# Altium footprint library IDC-Connectors.PcbLib: 32 footprints (part 2 of 2)
Each footprint in its own frame and in the unit in brackets; x right, y up, seen from the top. Pads: shape width x height; smd on the part's side, far side on the other; paste and mask are expansions set on the pad; w line width, h text height; cw(c..) or ccw(c..) is an arc to the next point about the centre after c.
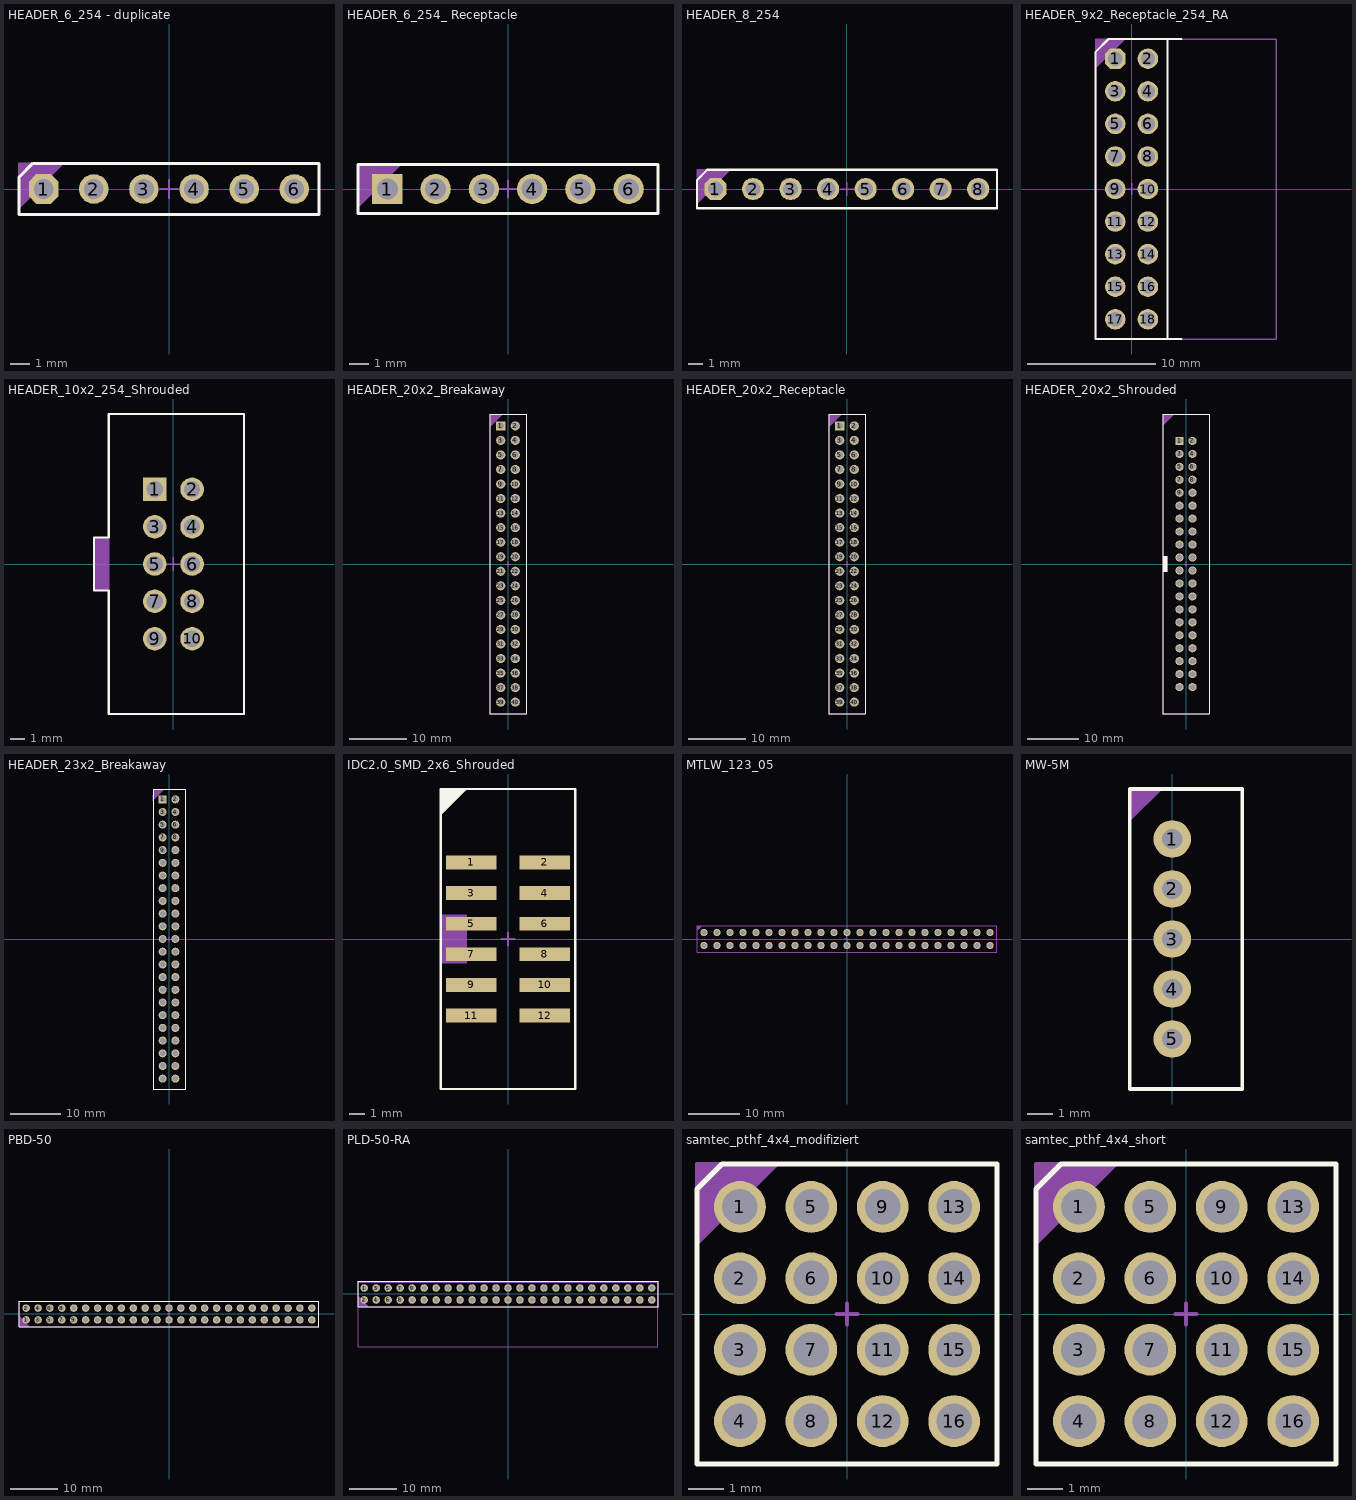
[diagram p1: the footprints below, top view; thin cyan lines are the x and y axes]

## HEADER_6_254 - duplicate [mm]
pads (6):
  oct 1.5x1.5 hole 1: 1(-6.35,0)
  round 1.5 hole 1: 2(-3.81,0) 3(-1.27,0) 4(1.27,0) 5(3.81,0) 6(6.35,0)
Top Overlay:
  lines w0.153: -7.6,-1.3 -7.6,0.6 -6.9,1.3 7.6,1.3 7.6,-1.3 -7.6,-1.3
Top Assembly:
  region: -7.6,1.3 -5.3,1.3 -7.6,-1
  lines w0.1: -7.6,-1.3 -7.6,1.3 7.6,1.3 7.6,-1.3 -7.6,-1.3
  text "'.Designator'" at -4.532,-0.333 h0.8
Top Courtyard:
  lines w0.1: -0.45,0 0.45,0 ; 0,-0.45 0,0.45 ; -7.6,-1.3 -7.6,1.3 7.6,1.3 7.6,-1.3 -7.6,-1.3

## HEADER_6_254_ Receptacle [mm]
pads (6):
  rect 1.6x1.6 hole 1.1: 1(-6.35,0)
  round 1.6 hole 1.1: 2(-3.81,0) 3(-1.27,0) 4(1.27,0) 5(3.81,0) 6(6.35,0)
Top Overlay:
  lines w0.153: -7.9,-1.3 7.9,-1.3 7.9,1.3 -7.9,1.3 -7.9,-1.3
  text "." at -8.796,1.779 h1.52
Top Assembly:
  region: -7.9,1.3 -5.6,1.3 -7.9,-1
  lines w0.1: -7.9,-1.3 -7.9,1.3 7.9,1.3 7.9,-1.3 -7.9,-1.3
  text "'.Designator'" at -4.532,-0.333 h0.8
Top Courtyard:
  lines w0.1: -0.45,0 0.45,0 ; 0,-0.45 0,0.45 ; -7.9,-1.3 -7.9,1.3 7.9,1.3 7.9,-1.3 -7.9,-1.3
3D body "User Library-Header_Fem_1X6 (1).step": height 8.5, standoff -3.2, extent -7.87,-1.27 7.87,1.27

## HEADER_8_254 [mm]
pads (8):
  oct 1.5x1.5 hole 1: 1(-8.89,0)
  round 1.5 hole 1: 2(-6.35,0) 3(-3.81,0) 4(-1.27,0) 5(1.27,0) 6(3.81,0) 7(6.35,0) 8(8.89,0)
Top Overlay:
  lines w0.153: -10.14,-1.3 -10.14,0.6 -9.44,1.3 10.16,1.3 10.16,-1.3 -10.14,-1.3
Top Assembly:
  region: -10.14,1.3 -7.84,1.3 -10.14,-1
  lines w0.1: -10.14,-1.3 -10.14,1.3 10.16,1.3 10.16,-1.3 -10.14,-1.3
  text "'.Designator'" at -4.532,-0.333 h0.8
Top Courtyard:
  lines w0.1: -0.45,0 0.45,0 ; 0,-0.45 0,0.45 ; -10.14,-1.3 -10.14,1.3 10.16,1.3 10.16,-1.3 -10.14,-1.3

## HEADER_9x2_Receptacle_254_RA [mm]
pads (18):
  oct 1.6x1.6 hole 1.1: 1(-1.27,10.16)
  round 1.6 hole 1.1: 2(1.27,10.16) 3(-1.27,7.62) 4(1.27,7.62) 5(-1.27,5.08) 6(1.27,5.08) 7(-1.27,2.54) 8(1.27,2.54) 9(-1.27,0) 10(1.27,0) 11(-1.27,-2.54) 12(1.27,-2.54) 13(-1.27,-5.08) 14(1.27,-5.08) 15(-1.27,-7.62) 16(1.27,-7.62) 17(-1.27,-10.16) 18(1.27,-10.16)
Top Overlay:
  lines w0.153: 2.4,11.7 3.9,11.7 ; 3.9,-11.7 2.8,-11.7 ; 2.8,-11.7 2.8,11.7 -1.8,11.7 -2.81,10.69 -2.81,-11.7 2.8,-11.7
Top Assembly:
  region: -2.8,11.7 -0.5,11.7 -2.8,9.4
  lines w0.1: -2.8,-11.7 -2.8,11.7 11.3,11.7 11.3,-11.7 -2.8,-11.7
  text "'.Designator'" at 0.153,0.42 h0.8
Top Courtyard:
  lines w0.1: -0.45,0 0.45,0 ; 0,-0.45 0,0.45 ; -2.81,-11.7 -2.81,11.7 11.3,11.7 11.3,-11.7 -2.81,-11.7
3D body "SSW_109_02_G_D_RA.STEP": height 4.98, standoff -2.5, extent -1.5,-11.684 11.276,11.684

## HEADER_10x2_254_Shrouded [mm]
pads (10):
  rect 1.6x1.6 hole 1.1: 1(-1.27,5.08)
  round 1.6 hole 1.1: 2(1.27,5.08) 3(-1.27,2.54) 4(1.27,2.54) 5(-1.27,0) 6(1.27,0) 7(-1.27,-2.54) 8(1.27,-2.54) 9(-1.27,-5.08) 10(1.27,-5.08)
Top Overlay:
  lines w0.153: -5.4,-1.8 -5.4,1.8 -4.4,1.8 -4.4,10.2 4.8,10.2 4.8,-10.2 -4.4,-10.2 -4.4,-1.8 -5.4,-1.8
  text "." at -1.346,6.654 h1.52
Top Assembly:
  rectangle: -5.4,-1.8 -4.4,1.8
  lines w0.1: -4.4,-1.8 -4.4,1.8 ; -4.4,-1.8 -4.4,-10.2 4.8,-10.2 4.8,10.2 -4.4,10.2 -4.4,1.8 ; -4.4,-1.8 -5.4,-1.8 -5.4,1.8 -4.4,1.8
  text "'.Designator'" at 0.333,-4.532 h0.8
Top Courtyard:
  rectangle: -5.4,-1.8 -4.4,1.8
  lines w0.1: -0.45,0 0.45,0 ; 0,-0.45 0,0.45 ; -4.4,-1.8 -4.4,1.8 ; -4.4,-1.8 -4.4,-10.2 4.8,-10.2 4.8,10.2 -4.4,10.2 -4.4,1.8 ; -4.4,-1.8 -5.4,-1.8 -5.4,1.8 -4.4,1.8
3D body "61201021621 (rev1).stp": height 9.13, standoff -2.98, extent -4.425,-10.18 4.748,10.18

## HEADER_20x2_Breakaway [mm]
pads (40):
  rect 1.6x1.6 hole 1.1: 1(-1.27,24.13)
  round 1.6 hole 1.1: 2(1.27,24.13) 3(-1.27,21.59) 4(1.27,21.59) 5(-1.27,19.05) 6(1.27,19.05) 7(-1.27,16.51) 8(1.27,16.51) 9(-1.27,13.97) 10(1.27,13.97) 11(-1.27,11.43) 12(1.27,11.43) 13(-1.27,8.89) 14(1.27,8.89) 15(-1.27,6.35) 16(1.27,6.35) 17(-1.27,3.81) 18(1.27,3.81) 19(-1.27,1.27) 20(1.27,1.27) 21(-1.27,-1.27) 22(1.27,-1.27) 23(-1.27,-3.81) 24(1.27,-3.81) 25(-1.27,-6.35) 26(1.27,-6.35) 27(-1.27,-8.89) 28(1.27,-8.89) 29(-1.27,-11.43) 30(1.27,-11.43) 31(-1.27,-13.97) 32(1.27,-13.97) 33(-1.27,-16.51) 34(1.27,-16.51) 35(-1.27,-19.05) 36(1.27,-19.05) 37(-1.27,-21.59) 38(1.27,-21.59) 39(-1.27,-24.13) 40(1.27,-24.13)
Top Overlay:
  lines w0.153: -3.2,-26.2 -3.2,26.2 3.2,26.2 3.2,-26.2 -3.2,-26.2
  text "." at -4.096,26.579 h1.52
Top Assembly:
  region: -3.2,26.2 -0.9,26.2 -3.2,23.9
  lines w0.1: -3.2,-26.2 3.2,-26.2 3.2,26.2 -3.2,26.2 -3.2,-26.2
  text "'.Designator'" at -3.221,26.782 h0.8
Top Courtyard:
  lines w0.1: -0.45,0 0.45,0 ; 0,-0.45 0,0.45 ; -3.2,-26.2 3.2,-26.2 3.2,26.2 -3.2,26.2 -3.2,-26.2
3D body "2-826925-0--3DModel-STEP-1.STEP": height 9.5, standoff -3.2, extent -2.47,-25.47 2.53,25.33

## HEADER_20x2_Receptacle [mm]
pads (40):
  rect 1.6x1.6 hole 1.1: 1(-1.27,24.13)
  round 1.6 hole 1.1: 2(1.27,24.13) 3(-1.27,21.59) 4(1.27,21.59) 5(-1.27,19.05) 6(1.27,19.05) 7(-1.27,16.51) 8(1.27,16.51) 9(-1.27,13.97) 10(1.27,13.97) 11(-1.27,11.43) 12(1.27,11.43) 13(-1.27,8.89) 14(1.27,8.89) 15(-1.27,6.35) 16(1.27,6.35) 17(-1.27,3.81) 18(1.27,3.81) 19(-1.27,1.27) 20(1.27,1.27) 21(-1.27,-1.27) 22(1.27,-1.27) 23(-1.27,-3.81) 24(1.27,-3.81) 25(-1.27,-6.35) 26(1.27,-6.35) 27(-1.27,-8.89) 28(1.27,-8.89) 29(-1.27,-11.43) 30(1.27,-11.43) 31(-1.27,-13.97) 32(1.27,-13.97) 33(-1.27,-16.51) 34(1.27,-16.51) 35(-1.27,-19.05) 36(1.27,-19.05) 37(-1.27,-21.59) 38(1.27,-21.59) 39(-1.27,-24.13) 40(1.27,-24.13)
Top Overlay:
  lines w0.153: -3.2,-26.2 3.2,-26.2 3.2,26.2 -3.2,26.2 -3.2,-26.2
  text "." at -4.396,26.679 h1.52
Top Assembly:
  region: -3.2,26.2 -0.9,26.2 -3.2,23.9
  lines w0.1: -3.2,-26.2 -3.2,26.2 3.2,26.2 3.2,-26.2 -3.2,-26.2
  text "'.Designator'" at -3.521,26.882 h0.8
Top Courtyard:
  lines w0.1: -0.45,0 0.45,0 ; 0,-0.45 0,0.45 ; -3.2,-26.2 -3.2,26.2 3.2,26.2 3.2,-26.2 -3.2,-26.2
3D body "m20-7832046.stp": height 8.5, standoff -3, extent -2.4,-25.6 2.6,25.6

## HEADER_20x2_Shrouded [mm]
pads (40):
  rect 1.6x1.6 hole 1.1: 1(-1.27,24.13)
  round 1.6 hole 1.1: 2(1.27,24.13) 3(-1.27,21.59) 4(1.27,21.59) 5(-1.27,19.05) 6(1.27,19.05) 7(-1.27,16.51) 8(1.27,16.51) 9(-1.27,13.97) 10(1.27,13.97) 11(-1.27,11.43) 12(1.27,11.43) 13(-1.27,8.89) 14(1.27,8.89) 15(-1.27,6.35) 16(1.27,6.35) 17(-1.27,3.81) 18(1.27,3.81) 19(-1.27,1.27) 20(1.27,1.27) 21(-1.27,-1.27) 22(1.27,-1.27) 23(-1.27,-3.81) 24(1.27,-3.81) 25(-1.27,-6.35) 26(1.27,-6.35) 27(-1.27,-8.89) 28(1.27,-8.89) 29(-1.27,-11.43) 30(1.27,-11.43) 31(-1.27,-13.97) 32(1.27,-13.97) 33(-1.27,-16.51) 34(1.27,-16.51) 35(-1.27,-19.05) 36(1.27,-19.05) 37(-1.27,-21.59) 38(1.27,-21.59) 39(-1.27,-24.13) 40(1.27,-24.13)
Top Overlay:
  rectangle: -4.6,-1.6 -3.6,1.6
  lines w0.153: -4.6,-29.4 -4.6,29.4 4.6,29.4 4.6,-29.4 -4.6,-29.4
  text "." at -5.546,30.054 h1.52
Top Assembly:
  rectangle: -4.6,-1.6 -3.6,1.6
  region: -4.6,29.4 -2.3,29.4 -4.6,27.1
  lines w0.1: -4.6,-29.4 4.6,-29.4 4.6,29.4 -4.6,29.4 -4.6,-29.4
  text "'.Designator'" at -4.421,30.282 h0.8
Top Courtyard:
  lines w0.1: -0.45,0 0.45,0 ; 0,-0.45 0,0.45 ; -4.6,-29.4 4.6,-29.4 4.6,29.4 -4.6,29.4 -4.6,-29.4
3D body "702464004.stp": height 9.55, standoff -3.14, extent -4.46,-29.19 4.43,29.23

## HEADER_23x2_Breakaway [mm]
pads (46):
  rect 1.6x1.6 hole 1.1: 1(-1.27,27.94)
  round 1.6 hole 1.1: 2(1.27,27.94) 3(-1.27,25.4) 4(1.27,25.4) 5(-1.27,22.86) 6(1.27,22.86) 7(-1.27,20.32) 8(1.27,20.32) 9(-1.27,17.78) 10(1.27,17.78) 11(-1.27,15.24) 12(1.27,15.24) 13(-1.27,12.7) 14(1.27,12.7) 15(-1.27,10.16) 16(1.27,10.16) 17(-1.27,7.62) 18(1.27,7.62) 19(-1.27,5.08) 20(1.27,5.08) 21(-1.27,2.54) 22(1.27,2.54) 23(-1.27,0) 24(1.27,0) 25(-1.27,-2.54) 26(1.27,-2.54) 27(-1.27,-5.08) 28(1.27,-5.08) 29(-1.27,-7.62) 30(1.27,-7.62) 31(-1.27,-10.16) 32(1.27,-10.16) 33(-1.27,-12.7) 34(1.27,-12.7) 35(-1.27,-15.24) 36(1.27,-15.24) 37(-1.27,-17.78) 38(1.27,-17.78) 39(-1.27,-20.32) 40(1.27,-20.32) 41(-1.27,-22.86) 42(1.27,-22.86) 43(-1.27,-25.4) 44(1.27,-25.4) 45(-1.27,-27.94) 46(1.27,-27.94)
Top Overlay:
  lines w0.153: -3.2,-30 -3.2,30 3.2,30 3.2,-30 -3.2,-30
  text "." at -4.096,30.389 h1.52
Top Assembly:
  region: -3.2,30 -0.9,30 -3.2,27.7
  lines w0.1: -3.2,-30 3.2,-30 3.2,30 -3.2,30 -3.2,-30
  text "'.Designator'" at -3.221,30.592 h0.8
Top Courtyard:
  lines w0.1: -0.45,0 0.45,0 ; 0,-0.45 0,0.45 ; -3.2,-30 3.2,-30 3.2,30 -3.2,30 -3.2,-30
3D body "User Library-46-pin dual header.step": height 8.24, standoff -2.18, extent -2.537,-29.265 2.537,29.155

## IDC2.0_SMD_2x6_Shrouded [mm]
pads (12):
  rect 3.3x0.9 smd: 1(-2.4,5) 2(2.4,5) 3(-2.4,3) 4(2.4,3) 5(-2.4,1) 6(2.4,1) 7(-2.4,-1) 8(2.4,-1) 9(-2.4,-3) 10(2.4,-3) 11(-2.4,-5) 12(2.4,-5)
Top Overlay:
  region: -4.4,9.8 -4.4,8.1 -2.7,9.8
  lines w0.153: -4.4,-9.8 4.4,-9.8 4.4,9.8 -4.4,9.8 -4.4,-9.8
Top Assembly:
  region: -4.4,1.6 -2.7,1.6 -2.7,-1.6 -4.4,-1.6
  lines w0.1: -4.4,-9.8 -4.4,9.8 4.4,9.8 4.4,-9.8 -4.4,-9.8
  text "'.Designator'" at 0.333,-4.532 h0.8
Top Courtyard:
  lines w0.1: -0.45,0 0.45,0 ; 0,-0.45 0,0.45 ; -4.4,-9.8 4.4,-9.8 4.4,9.8 -4.4,9.8 -4.4,-9.8
3D body "User Library-957-Series 12 Pol.step": height 6.7, standoff 0, extent -3.7,-9.6 3.9,9.6

## MTLW_123_05 [mm]
pads (46):
  round 1.4 hole 1: 1(-27.94,1.27) 2(-27.94,-1.27) 3(-25.4,1.27) 4(-25.4,-1.27) 5(-22.86,1.27) 6(-22.86,-1.27) 7(-20.32,1.27) 8(-20.32,-1.27) 9(-17.78,1.27) 10(-17.78,-1.27) 11(-15.24,1.27) 12(-15.24,-1.27) 13(-12.7,1.27) 14(-12.7,-1.27) 15(-10.16,1.27) 16(-10.16,-1.27) 17(-7.62,1.27) 18(-7.62,-1.27) 19(-5.08,1.27) 20(-5.08,-1.27) 21(-2.54,1.27) 22(-2.54,-1.27) 23(0,1.27) 24(0,-1.27) 25(2.54,1.27) 26(2.54,-1.27) 27(5.08,1.27) 28(5.08,-1.27) 29(7.62,1.27) 30(7.62,-1.27) 31(10.16,1.27) 32(10.16,-1.27) 33(12.7,1.27) 34(12.7,-1.27) 35(15.24,1.27) 36(15.24,-1.27) 37(17.78,1.27) 38(17.78,-1.27) 39(20.32,1.27) 40(20.32,-1.27) 41(22.86,1.27) 42(22.86,-1.27) 43(25.4,1.27) 44(25.4,-1.27) 45(27.94,1.27) 46(27.94,-1.27)
Bottom Overlay:
  region: -29.3,2.6 -29.3,1.7 -28.4,2.6
  lines w0.153: -29.3,1.7 -28.4,2.6 ; -29.3,-2.6 -29.3,2.6 29.3,2.6 29.3,-2.6 -29.3,-2.6
Bottom Assembly:
  region: -29.3,2.6 -29.3,1.7 -28.4,2.6
  lines w0.1: -29.3,1.7 -28.4,2.6 ; -29.3,-2.6 29.3,-2.6 29.3,2.6 -29.3,2.6 -29.3,-2.6
  text ".Designator" at 3.999,-0.267 h0.8
Bottom Courtyard:
  lines w0.1: -0.5,0.005 0,0.005 0,-0.495 ; -0.004,0.5 -0.004,0 0.496,0 ; -29.3,-2.6 29.3,-2.6 29.3,2.6 -29.3,2.6 -29.3,-2.6
3D body "MTLW-123-05-G-D-000.stp": height 1.52, standoff -6.98, extent -29.21,-2.515 29.21,2.515

## MW-5M [mm]
pads (5):
  round 1.5 hole 0.8: 1(0,4) 2(0,2) 3(0,0) 4(0,-2) 5(0,-4)
Top Overlay:
  lines w0.153: -1.7,-6 2.8,-6 2.8,6 -1.7,6 -1.7,-6
  text "." at -2.567,4.033 h0.8
Top Assembly:
  region: -1.7,6 -0.4,6 -1.7,4.7
  lines w0.1: -1.7,-6 -1.7,6 2.8,6 2.8,-6 -1.7,-6
  text "." at -2.567,4.033 h0.8
  text "'.Designator'" at 0.833,-4.332 h0.8
Top Courtyard:
  lines w0.1: -0.3,0 0.3,0 ; 0,-0.3 0,0.3 ; -1.7,-6 2.8,-6 2.8,6 -1.7,6 -1.7,-6
3D body "User Library-BxB-PH.step": height 6, standoff -3.3, extent -1.7,-5.95 2.8,5.95

## PBD-50 [mm]
pads (50):
  round 1.6 hole 1 paste-2539.97: 1(-30.48,-1.27) 2(-30.48,1.27) 3(-27.94,-1.27) 4(-27.94,1.27) 5(-25.4,-1.27) 6(-25.4,1.27) 7(-22.86,-1.27) 8(-22.86,1.27) 9(-20.32,-1.27) 10(-20.32,1.27) 11(-17.78,-1.27) 12(-17.78,1.27) 13(-15.24,-1.27) 14(-15.24,1.27) 15(-12.7,-1.27) 16(-12.7,1.27)
  round 1.6 hole 1: 17(-10.16,-1.27) 18(-10.16,1.27) 19(-7.62,-1.27) 20(-7.62,1.27) 21(-5.08,-1.27) 22(-5.08,1.27) 23(-2.54,-1.27) 24(-2.54,1.27) 25(0,-1.27) 26(0,1.27) 27(2.54,-1.27) 28(2.54,1.27) 29(5.08,-1.27) 30(5.08,1.27) 31(7.62,-1.27) 32(7.62,1.27) 33(10.16,-1.27) 34(10.16,1.27) 35(12.7,-1.27) 36(12.7,1.27) 37(15.24,-1.27) 38(15.24,1.27) 39(17.78,-1.27) 40(17.78,1.27) 41(20.32,-1.27) 42(20.32,1.27) 43(22.86,-1.27) 44(22.86,1.27) 45(25.4,-1.27) 46(25.4,1.27) 47(27.94,-1.27) 48(27.94,1.27) 49(30.48,-1.27) 50(30.48,1.27)
Top Overlay:
  lines w0.153: -32,-2.7 -32,2.7 32,2.7 32,-2.7 -32,-2.7
  text "." at -30.354,-3.846 h1.52
Top Assembly:
  region: -32,-2.7 -32,-0.4 -29.7,-2.7
  lines w0.1: -32,-2.7 -32,2.7 ; -31.8,-2.7 32,-2.7 32,2.7 -31.8,2.7
  text "'.Designator'" at -4.532,-0.333 h0.8
  text "NEED TO BE FIXED" at -4.398,3.7 h0.8
Top Courtyard:
  lines w0.1: -0.3,0 0.3,0 ; 0,-0.3 0,0.3 ; -32,-2.7 32,-2.7 32,2.7 -32,2.7 -32,-2.7
3D body "SSW_125_01_G_D.STEP": height 8.51, standoff -2.64, extent -32.004,-2.476 32.004,2.476

## PLD-50-RA [mm]
pads (50):
  round 1.6 hole 1 paste-2539.97: 1(-30.48,1.27) 2(-30.48,-1.27) 3(-27.94,1.27) 4(-27.94,-1.27) 5(-25.4,1.27) 6(-25.4,-1.27)
  round 1.6 hole 1: 7(-22.86,1.27) 8(-22.86,-1.27) 9(-20.32,1.27) 10(-20.32,-1.27) 11(-17.78,1.27) 12(-17.78,-1.27) 13(-15.24,1.27) 14(-15.24,-1.27) 15(-12.7,1.27) 16(-12.7,-1.27) 17(-10.16,1.27) 18(-10.16,-1.27) 19(-7.62,1.27) 20(-7.62,-1.27) 21(-5.08,1.27) 22(-5.08,-1.27) 23(-2.54,1.27) 24(-2.54,-1.27) 25(0,1.27) 26(0,-1.27) 27(2.54,1.27) 28(2.54,-1.27) 29(5.08,1.27) 30(5.08,-1.27) 31(7.62,1.27) 32(7.62,-1.27) 33(10.16,1.27) 34(10.16,-1.27) 35(12.7,1.27) 36(12.7,-1.27) 37(15.24,1.27) 38(15.24,-1.27) 39(17.78,1.27) 40(17.78,-1.27) 41(20.32,1.27) 42(20.32,-1.27) 43(22.86,1.27) 44(22.86,-1.27) 45(25.4,1.27) 46(25.4,-1.27) 47(27.94,1.27) 48(27.94,-1.27) 49(30.48,1.27) 50(30.48,-1.27)
Top Overlay:
  lines w0.153: -31.8,-2.7 31.8,-2.7 31.8,2.7 -31.8,2.7 -31.8,-2.7
  text "." at -30.354,-3.846 h1.52
Mechanical 1:
  lines w0.2: -31.75,-11.182 31.75,-11.182 31.75,2.53 -31.75,2.53 -31.75,-11.182
  text ".Designator" at -0.84,-0.47 h1
Top Assembly:
  region: -31.8,-2.7 -31.8,-0.4 -29.5,-2.7
  lines w0.1: -31.8,-2.7 -31.8,2.7 31.8,2.7 31.8,-2.7 -31.8,-2.7
  text "'.Designator'" at -4.532,-0.333 h0.8
Top Courtyard:
  lines w0.1: -0.3,0 0.3,0 ; 0,-0.3 0,0.3 ; -31.8,-2.7 -31.8,2.7 31.8,2.7 31.8,-2.7 -31.8,-2.7
3D body "TSW_125_22_G_D_RA.STEP": height 5.54, standoff -4.85, extent -31.75,-11.182 31.75,1.582

## samtec_pthf_4x4_modifiziert [mm]
pads (16):
  round 1.45 hole 1: 1(-3,3) 2(-3,1) 3(-3,-1) 4(-3,-3) 5(-1,3) 6(-1,1) 7(-1,-1) 8(-1,-3) 9(1,3) 10(1,1) 11(1,-1) 12(1,-3) 13(3,3) 14(3,1) 15(3,-1) 16(3,-3)
Top Overlay:
  lines w0.153: -4.2,-4.2 -4.2,3.5 -3.5,4.2 4.2,4.2 4.2,-4.2 -4.2,-4.2
Top Assembly:
  region: -4.2,4.2 -1.9,4.2 -4.2,1.9
  lines w0.1: -4.2,-4.2 -4.2,4.2 4.2,4.2 4.2,-4.2 -4.2,-4.2
  text "'.Designator'" at -4.532,-0.333 h0.8
Top Courtyard:
  lines w0.1: -0.3,0 0.3,0 ; 0,-0.3 0,0.3 ; -4.2,-4.2 -4.2,4.2 4.2,4.2 4.2,-4.2 -4.2,-4.2
3D body "Samtec-PTHF-130-02-GF-Q-368_4x4_modif.stp": height 9.35, standoff -12.24, extent -3.854,-4 4.003,4.001

## samtec_pthf_4x4_short [mm]
pads (16):
  round 1.45 hole 1: 1(-3,3) 2(-3,1) 3(-3,-1) 4(-3,-3) 5(-1,3) 6(-1,1) 7(-1,-1) 8(-1,-3) 9(1,3) 10(1,1) 11(1,-1) 12(1,-3) 13(3,3) 14(3,1) 15(3,-1) 16(3,-3)
Top Overlay:
  lines w0.153: -4.2,-4.2 -4.2,3.5 -3.5,4.2 4.2,4.2 4.2,-4.2 -4.2,-4.2
Top Assembly:
  region: -4.2,4.2 -1.9,4.2 -4.2,1.9
  lines w0.1: -4.2,-4.2 -4.2,4.2 4.2,4.2 4.2,-4.2 -4.2,-4.2
  text "'.Designator'" at -4.532,-0.333 h0.8
Top Courtyard:
  lines w0.1: -0.3,0 0.3,0 ; 0,-0.3 0,0.3 ; -4.2,-4.2 -4.2,4.2 4.2,4.2 4.2,-4.2 -4.2,-4.2
3D body "Samtec-PTHF-130-03-H-Q-368_4x4_modif.STEP": height 9.35, standoff -2.62, extent -3.85,-4 4.007,4